# Altium footprint library general.PcbLib: 66 footprints (part 5 of 5)
Each footprint in its own frame and in the unit in brackets; x right, y up, seen from the top. Pads: shape width x height; smd on the part's side, far side on the other; paste and mask are expansions set on the pad; w line width, h text height; cw(c..) or ccw(c..) is an arc to the next point about the centre after c.
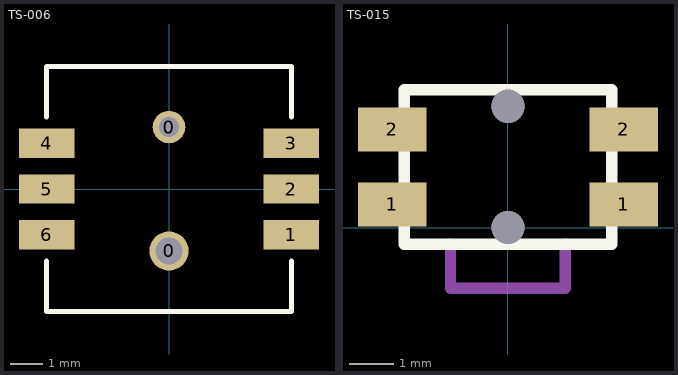
[diagram p4: the footprints below, top view; thin cyan lines are the x and y axes]

## TS-006 [mm]
pads (8):
  round 1.2 hole 0.82: 0(0,-1.9)
  round 1 hole 0.62: 0(0,1.9)
  rect 1.7x0.9 smd: 1(3.75,-1.4) 2(3.75,0) 3(3.75,1.4) 4(-3.75,1.4) 5(-3.75,0) 6(-3.75,-1.4)
Top Overlay:
  lines w0.152: -3.75,-2.2 -3.75,-3.75 3.75,-3.75 3.75,-2.2 ; -3.75,2.2 -3.75,3.75 3.75,3.75 3.75,2.2

## TS-015 [mm]
pads (4):
  rect 1.55x1 smd: 1(-2.625,0.525) 1(2.625,0.525) 2(-2.625,2.225) 2(2.625,2.225)
via 0,2.75 diameter 0.75 hole 0.75
via 0,0 diameter 0.75 hole 0.75
Top Overlay:
  lines w0.254: 2.35,3.055 2.35,-0.375 -2.35,-0.375 -2.35,3.125 2.35,3.125
Mechanical 1:
  lines w0.254: -1.3,-0.375 -1.3,-1.375 1.3,-1.375 1.3,-0.375